# Altium footprint library ThanhNT.PcbLib: 579 footprints (part 31 of 37)
Each footprint in its own frame and in the unit in brackets; x right, y up, seen from the top. Pads: shape width x height; smd on the part's side, far side on the other; paste and mask are expansions set on the pad; w line width, h text height; cw(c..) or ccw(c..) is an arc to the next point about the centre after c.
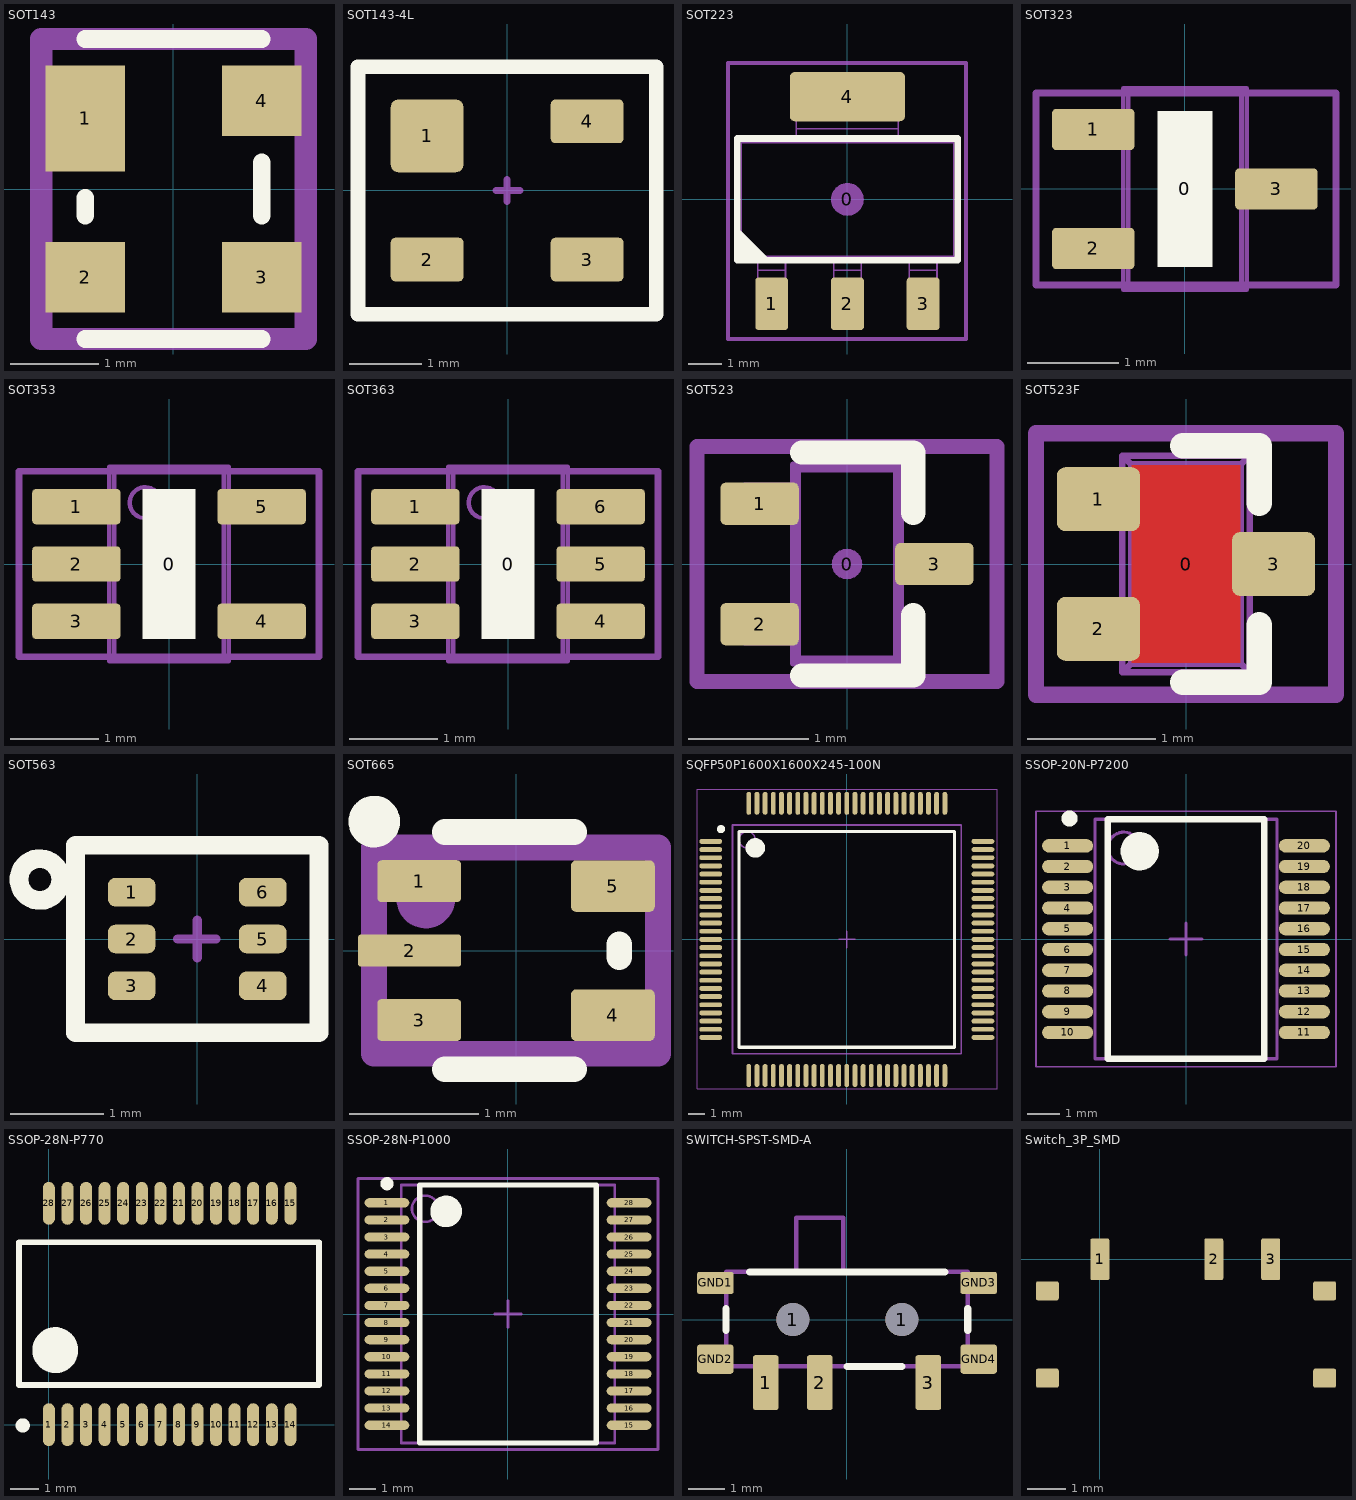
[diagram p30: the footprints below, top view; thin cyan lines are the x and y axes]

## SOT143 [mm]
pads (4):
  rect 0.9x1.2 smd: 1(-1,0.8)
  rect 0.9x0.8 smd: 2(-1,-1) 3(1,-1) 4(1,1)
Top Overlay:
  lines w0.2: -1,-1.7 1,-1.7 ; -1,-0.3 -1,-0.1 ; -1,1.7 1,1.7 ; 1,-0.3 1,0.3
Mechanical 16:
  circle w0.254: c-1,1.1 r0.1
  lines w0.254: -1.5,-1.7 -1.5,1.7 1.5,1.7 1.5,-1.7 -1.5,-1.7
3D body: height 1, standoff 0, extent -1,-1.7 1,1.7

## SOT143-4L [mm] "SOT143-4L, 4-Leads, Body 2.95x2.4mm, Pitch 1.70/1.90mm"
height 1.075
pads (4):
  rrect20% 1x1 smd: 1(-1.1,0.75)
  rrect20% 1x0.6 smd: 2(-1.1,-0.95) 3(1.1,-0.95) 4(1.1,0.95)
Top Overlay:
  lines w0.2: -2.05,-1.7 2.05,-1.7 2.05,1.7 -2.05,1.7 -2.05,-1.675
  text "." at -2.408,0.777 h0.1
Mechanical 15:
  lines w0.1: -2.05,-1.7 -2.05,1.7 ; -0.15,0 0.175,0 ; 0,-0.15 0,0.15 ; 2.075,-1.688 2.075,1.741
  lines w0.102: -2.05,-1.7 2.05,-1.7 ; -1.989,1.741 2.075,1.741
3D body "WE-TVS_High_Speed_SOT143-4L.stp": height 1.03, standoff -0.03, extent -1.2,-1.46 1.2,1.46

## SOT223 [mm] "SOT223 /SC-73"
height 1.524
pads (5):
  round 1 on Mech15: 0(0,0)
  rrect20% 1x1.6 smd: 1(-2.3,-3.173) 2(0,-3.173) 3(2.3,-3.173)
  rrect20% 3.5x1.5 smd: 4(0,3.124)
Top Overlay:
  region: -3.35,-1.85 -3.35,-0.85 -2.35,-1.85
  lines w0.2: -3.35,-1.85 -3.35,1.85 3.35,1.85 3.35,-1.85 -3.35,-1.85
Mechanical 13:
  lines w0.05: -2.72,-3.186 -1.88,-3.186 ; -2.72,-3.062 -1.88,-3.062 ; -2.72,-2.506 -1.88,-2.506 ; -2.72,-2.152 -1.88,-2.152 ; -2.72,-1.85 -3.35,-1.85 ; -1.88,-1.85 -0.42,-1.85 ; -1.55,1.85 -3.35,1.85 ; -1.55,2.152 1.55,2.152 ; -1.55,2.506 1.55,2.506 ; -1.55,3.062 1.55,3.062 ; -1.55,3.186 1.55,3.186 ; -0.42,-3.186 0.42,-3.186 ; -0.42,-3.062 0.42,-3.062 ; -0.42,-2.506 0.42,-2.506 ; -0.42,-2.152 0.42,-2.152 ; 0.42,-1.85 1.88,-1.85 ; 1.55,1.85 3.35,1.85 ; 1.88,-3.186 2.72,-3.186 ; 1.88,-3.062 2.72,-3.062 ; 1.88,-2.506 2.72,-2.506 ; 1.88,-2.152 2.72,-2.152 ; 2.72,-1.85 3.35,-1.85 ; -3.35,-1.85 -3.35,1.85 ; -3.35,-1.85 -3.231,-1.731 ; -3.35,1.85 -3.231,1.731 ; -3.231,-1.731 3.231,-1.731 ; -3.231,-1.731 -3.231,1.731 ; -3.231,1.731 3.231,1.731 ; 3.231,-1.731 3.231,1.731 ; 3.231,-1.731 3.35,-1.85 ; 3.231,1.731 3.35,1.85 ; 3.35,-1.85 3.35,1.85 ; -2.72,-3.65 -2.72,-1.829 -1.88,-1.829 -1.88,-3.65 -2.72,-3.65 ; -1.55,1.829 1.55,1.829 1.55,3.65 -1.55,3.65 -1.55,1.829 ; -0.42,-3.65 -0.42,-1.829 0.42,-1.829 0.42,-3.65 -0.42,-3.65 ; 1.88,-3.65 1.88,-1.829 2.72,-1.829 2.72,-3.65 1.88,-3.65
Mechanical 15:
  lines w0.127: -3.632,-4.242 3.607,-4.242 3.607,4.14 -3.632,4.14 -3.632,-4.242
3D body "User Library-SOT223-3.STEP": height 1.7, standoff 0, extent -3.25,-3.5 3.25,3.5

## SOT323 [mm] "Small outline 2.1mm L x 1.25mm W x 1.1mm H; 3 lead SC70, EIAJ SC-70, SOT323"
height 1.1
pads (4):
  round 0.5 on Mech15: 0(0,0)
  rrect20% 0.9x0.45 smd: 1(-1,0.65) 2(-1,-0.65) 3(1,0)
Top Overlay:
  rectangle: -0.3,-0.85 0.3,0.85
  text "." at -1.875,0.65 h0.1
Mechanical 13:
  lines w0.05: -1.028,-0.8 -1.028,-0.5 ; -1.028,0.5 -1.028,0.8 ; -0.937,-0.8 -0.937,-0.5 ; -0.937,0.5 -0.937,0.8 ; -0.925,-0.8 -0.925,-0.5 ; -0.925,0.5 -0.925,0.8 ; 0.925,-0.15 0.925,0.15 ; 0.937,-0.15 0.937,0.15 ; 1.028,-0.15 1.028,0.15 ; -0.675,-1.1 0.675,-1.1 ; -0.675,-1.1 -0.675,1.1 ; -0.675,-1.1 -0.619,-1.044 ; -0.675,1.1 0.675,1.1 ; -0.675,1.1 -0.619,1.043 ; -0.619,-1.044 0.619,-1.044 ; -0.619,-1.044 -0.619,1.043 ; -0.619,1.043 0.619,1.043 ; 0.619,-1.044 0.675,-1.1 ; 0.619,-1.044 0.619,1.043 ; 0.619,1.043 0.675,1.1 ; 0.675,-1.1 0.675,1.1 ; -1.2,-0.8 -1.2,-0.5 -0.654,-0.5 -0.654,-0.8 -1.2,-0.8 ; -1.2,0.5 -1.2,0.8 -0.654,0.8 -0.654,0.5 -1.2,0.5 ; 0.654,-0.15 1.2,-0.15 1.2,0.15 0.654,0.15 0.654,-0.15
Mechanical 15:
  lines w0.076: -1.626,-1.05 -1.626,1.05 1.651,1.05 1.651,-1.05 -1.626,-1.05
3D body "SOT323.STEP": height 1.1, standoff 0, extent -1.2,-1.1 1.2,1.1

## SOT353 [mm] "Small outline 2.1mm L x 1.25mm W x 1mm H; 5LD SC-70; SC-88A"
height 1.1
pads (6):
  round 0.5 on Mech15: 0(0,0)
  rrect20% 1x0.4 smd: 1(-1.05,0.65) 2(-1.05,0) 3(-1.05,-0.65) 4(1.05,-0.65) 5(1.05,0.65)
Top Overlay:
  rectangle: -0.3,-0.85 0.3,0.85
  text "." at -2.025,0.65 h0.1
Top Solder:
  rectangle: -1.397,-0.762 -0.635,0.762
Mechanical 13:
  circle w0.05: c-0.27,0.695 r0.175
  lines w0.05: -1.028,-0.8 -1.028,-0.5 ; -1.028,-0.15 -1.028,0.15 ; -1.028,0.5 -1.028,0.8 ; -0.937,-0.8 -0.937,-0.5 ; -0.937,-0.15 -0.937,0.15 ; -0.937,0.5 -0.937,0.8 ; -0.925,-0.8 -0.925,-0.5 ; -0.925,-0.15 -0.925,0.15 ; -0.925,0.5 -0.925,0.8 ; 0.925,-0.8 0.925,-0.5 ; 0.925,0.5 0.925,0.8 ; 0.937,-0.8 0.937,-0.5 ; 0.937,0.5 0.937,0.8 ; 1.028,-0.8 1.028,-0.5 ; 1.028,0.5 1.028,0.8 ; -0.675,-1.1 0.675,-1.1 ; -0.675,-1.1 -0.675,1.1 ; -0.675,-1.1 -0.619,-1.044 ; -0.675,1.1 0.675,1.1 ; -0.675,1.1 -0.619,1.044 ; -0.619,-1.044 0.619,-1.044 ; -0.619,-1.044 -0.619,1.044 ; -0.619,1.044 0.619,1.044 ; 0.619,-1.044 0.675,-1.1 ; 0.619,-1.044 0.619,1.044 ; 0.619,1.044 0.675,1.1 ; 0.675,-1.1 0.675,1.1 ; -1.2,-0.8 -1.2,-0.5 -0.654,-0.5 -0.654,-0.8 -1.2,-0.8 ; -1.2,-0.15 -1.2,0.15 -0.654,0.15 -0.654,-0.15 -1.2,-0.15 ; -1.2,0.5 -1.2,0.8 -0.654,0.8 -0.654,0.5 -1.2,0.5 ; 0.654,-0.8 1.2,-0.8 1.2,-0.5 0.654,-0.5 0.654,-0.8 ; 0.654,0.5 1.2,0.5 1.2,0.8 0.654,0.8 0.654,0.5
Mechanical 15:
  lines w0.076: -1.7,-1.05 1.7,-1.05 1.7,1.05 -1.7,1.05 -1.7,-1.05
3D body "SOT353.STEP": height 1.1, standoff 0, extent -1.2,-1.1 1.2,1.1

## SOT363 [mm] "Small outline 2.1mm L x 1.25mm W x 1mm H"
height 1
pads (7):
  round 0.5 on Mech15: 0(0,0)
  rrect20% 1x0.4 smd: 1(-1.05,0.65) 2(-1.05,0) 3(-1.05,-0.65) 4(1.05,-0.65) 5(1.05,0) 6(1.05,0.65)
Top Overlay:
  rectangle: -0.3,-0.85 0.3,0.85
  text "." at -2.025,0.65 h0.1
Top Solder:
  region: 1.397,0.762 0.635,0.762 0.635,-0.762 1.397,-0.762
  rectangle: -1.397,-0.762 -0.635,0.762
Mechanical 13:
  circle w0.05: c-0.27,0.695 r0.175
  lines w0.05: -1.028,-0.8 -1.028,-0.5 ; -1.028,-0.15 -1.028,0.15 ; -1.028,0.5 -1.028,0.8 ; -0.937,-0.8 -0.937,-0.5 ; -0.937,-0.15 -0.937,0.15 ; -0.937,0.5 -0.937,0.8 ; -0.925,-0.8 -0.925,-0.5 ; -0.925,-0.15 -0.925,0.15 ; -0.925,0.5 -0.925,0.8 ; 0.925,-0.8 0.925,-0.5 ; 0.925,-0.15 0.925,0.15 ; 0.925,0.5 0.925,0.8 ; 0.937,-0.8 0.937,-0.5 ; 0.937,-0.15 0.937,0.15 ; 0.937,0.5 0.937,0.8 ; 1.028,-0.8 1.028,-0.5 ; 1.028,-0.15 1.028,0.15 ; 1.028,0.5 1.028,0.8 ; -0.675,-1.1 -0.619,-1.044 ; -0.675,-1.1 -0.675,1.1 ; -0.675,-1.1 0.675,-1.1 ; -0.675,1.1 -0.619,1.044 ; -0.675,1.1 0.675,1.1 ; -0.619,-1.044 -0.619,1.044 ; -0.619,-1.044 0.619,-1.044 ; -0.619,1.044 0.619,1.044 ; 0.619,-1.044 0.619,1.044 ; 0.619,-1.044 0.675,-1.1 ; 0.619,1.044 0.675,1.1 ; 0.675,-1.1 0.675,1.1 ; -1.2,-0.8 -0.654,-0.8 -0.654,-0.5 -1.2,-0.5 -1.2,-0.8 ; -1.2,-0.15 -0.654,-0.15 -0.654,0.15 -1.2,0.15 -1.2,-0.15 ; -1.2,0.5 -0.654,0.5 -0.654,0.8 -1.2,0.8 -1.2,0.5 ; 0.654,-0.8 0.654,-0.5 1.2,-0.5 1.2,-0.8 0.654,-0.8 ; 0.654,-0.15 0.654,0.15 1.2,0.15 1.2,-0.15 0.654,-0.15 ; 0.654,0.5 0.654,0.8 1.2,0.8 1.2,0.5 0.654,0.5
Mechanical 15:
  lines w0.076: -1.7,-1.05 1.7,-1.05 1.7,1.05 -1.7,1.05 -1.7,-1.05
3D body "SOT363.STEP": height 1.1, standoff 0, extent -1.2,-1.1 1.2,1.1

## SOT523 [mm] "3 Lead SC75; EIAJ-SC75; SOT523; SOT416?"
height 0.9
pads (4):
  round 0.254 on Mech15: 0(0,0)
  rrect25% 0.65x0.35 smd: 1(-0.725,0.5) 2(-0.725,-0.5) 3(0.725,0)
Top Overlay:
  lines w0.2: -0.375,-0.925 0.55,-0.925 0.55,-0.425 ; -0.375,0.925 0.55,0.925 0.55,0.425
  text "." at -1.455,0.5 h0.05
Mechanical 13:
  lines w0.05: -0.669,-0.65 -0.669,-0.35 ; -0.669,0.35 -0.669,0.65 ; -0.623,-0.65 -0.623,-0.35 ; -0.623,0.35 -0.623,0.65 ; -0.61,-0.65 -0.61,-0.35 ; -0.61,0.35 -0.61,0.65 ; 0.61,-0.15 0.61,0.15 ; 0.623,-0.15 0.623,0.15 ; 0.669,-0.15 0.669,0.15 ; -0.45,-0.825 -0.408,-0.783 ; -0.45,-0.825 -0.45,0.825 ; -0.45,-0.825 0.45,-0.825 ; -0.45,0.825 -0.408,0.783 ; -0.45,0.825 0.45,0.825 ; -0.408,-0.783 -0.408,0.783 ; -0.408,-0.783 0.408,-0.783 ; -0.408,0.783 0.408,0.783 ; 0.408,-0.783 0.408,0.783 ; 0.408,-0.783 0.45,-0.825 ; 0.408,0.783 0.45,0.825 ; 0.45,-0.825 0.45,0.825 ; -0.85,-0.65 -0.429,-0.65 -0.429,-0.35 -0.85,-0.35 -0.85,-0.65 ; -0.85,0.35 -0.429,0.35 -0.429,0.65 -0.85,0.65 -0.85,0.35 ; 0.429,-0.15 0.429,0.15 0.85,0.15 0.85,-0.15 0.429,-0.15
Mechanical 15:
  lines w0.127: -1.245,-0.975 -1.245,0.975 1.245,0.975 1.245,-0.975 -1.245,-0.975
3D body "SOT523.STEP": height 0.9, standoff 0, extent -0.85,-0.825 0.85,0.825

## SOT523F [mil] "3 Lead SC89; EIAJ-SC89; SOT523F"
height 31.5
pads (4):
  round 10 on Mech15: 0(0,0)
  rrect25% 25.59x19.68 smd: 1(-27,20) 2(-27,-20) 3(27,0)
Top Layer:
  pour cut-out: -16.73,30.51 16.73,30.51 16.73,-30.51 -16.73,-30.51
Top Overlay:
  lines w7.87: -0.98,-36.42 22.64,-36.42 22.64,-18.7 ; -0.98,36.42 22.64,36.42 22.64,18.7
  text "." at -51.18,19.68 h1.97
Mechanical 13:
  lines w1.97: -19.65,-26.57 -19.65,-33.43 ; -19.65,-12.8 -19.65,12.8 ; -19.65,26.57 -19.65,33.43 ; 19.65,-6.89 19.65,-33.43 ; 19.65,6.89 19.65,33.43 ; -19.65,-33.43 -16.93,-30.71 ; -19.65,-33.43 19.65,-33.43 ; -19.65,33.43 -16.93,30.71 ; -19.65,33.43 19.65,33.43 ; -16.93,-30.71 -16.93,30.71 ; -16.93,-30.71 16.93,-30.71 ; -16.93,30.71 16.93,30.71 ; 16.93,-30.71 19.65,-33.43 ; 16.93,-30.71 16.93,30.71 ; 16.93,30.71 19.65,33.43 ; -33.46,-26.57 -19,-26.57 -19,-12.8 -33.46,-12.8 -33.46,-26.57 ; -33.46,12.8 -19,12.8 -19,26.57 -33.46,26.57 -33.46,12.8 ; 19,-6.89 19,6.89 33.46,6.89 33.46,-6.89 19,-6.89
Mechanical 15:
  lines w5: -46.26,-40.35 -46.26,40.35 46.26,40.35 46.26,-40.35 -46.26,-40.35
3D body "SOT523F.STEP": height 31.5, standoff 0, extent -33.46,-33.43 33.48,33.43

## SOT563 [mil] "SOT563, 6-Leads, Body 1.6x1.6mm, Pitch 0.5mm"
height 45.67
pads (6):
  rrect50% 20x12 smd: 1(-27.56,19.68) 2(-27.56,0) 3(-27.56,-19.68) 4(27.56,-19.68) 5(27.56,0) 6(27.56,19.68)
Top Overlay:
  circle w7.87: c-66.14,25 r8.77
  lines w7.87: -51.18,-39.37 51.18,-39.37 51.18,39.37 -51.18,39.37 -51.18,-39.37
Mechanical 15:
  lines w3.94: -51.18,-39.37 -51.18,39.37 ; -8.19,0 7.87,0 ; 0,-7.87 0,7.87 ; 51.18,-39.37 51.18,39.37
  lines w4: -51.18,-39.37 51.18,-39.37 ; -51.18,39.37 51.18,39.37
3D body "WE-TVS_High_Speed_SOT563.stp": height 21.65, standoff 0, extent -31.49,-31.5 31.51,31.5

## SOT665 [mm]
pads (5):
  rrect20% 0.65x0.325 smd mask+0.05: 1(-0.75,0.538) 3(-0.75,-0.538)
  rrect20% 0.8x0.25 smd mask+0.05: 2(-0.825,0)
  rrect20% 0.65x0.4 smd mask+0.05: 4(0.75,-0.5) 5(0.75,0.5)
Top Overlay:
  circle w0.2: c-1.1,1 r0.1
  lines w0.2: -0.55,-0.92 0.45,-0.92 ; -0.55,0.92 0.45,0.92 ; 0.8,-0.05 0.8,0.05
Mechanical 16:
  circle w0.254: c-0.7,0.4 r0.1
  lines w0.2: -1.1,-0.8 -1.1,0.8 1.1,0.8 1.1,-0.8 -1.1,-0.8
3D body "SOT50P160X60-5.step": height 0.6, standoff 0, extent -0.8,-0.796 0.8,0.795

## SQFP50P1600X1600X245-100N [mm] "SQFP, 100-Leads, Body 14.00x14.00mm, Pitch 0.50mm, IPC Medium Density"
height 2.45
pads (100):
  oval 1.4x0.3 smd: 1(-8.331,6) 2(-8.331,5.5) 3(-8.331,5) 4(-8.331,4.5) 5(-8.331,4) 6(-8.331,3.5) 7(-8.331,3) 8(-8.331,2.5) 9(-8.331,2) 10(-8.331,1.5) 11(-8.331,1) 12(-8.331,0.5) 13(-8.331,0) 14(-8.331,-0.5) 15(-8.331,-1) 16(-8.331,-1.5) 17(-8.331,-2) 18(-8.331,-2.5) 19(-8.331,-3) 20(-8.331,-3.5) 21(-8.331,-4) 22(-8.331,-4.5) 23(-8.331,-5) 24(-8.331,-5.5) 25(-8.331,-6) 51(8.331,-6) 52(8.331,-5.5) 53(8.331,-5) 54(8.331,-4.5) 55(8.331,-4) 56(8.331,-3.5) 57(8.331,-3) 58(8.331,-2.5) 59(8.331,-2) 60(8.331,-1.5) 61(8.331,-1) 62(8.331,-0.5) 63(8.331,0) 64(8.331,0.5) 65(8.331,1) 66(8.331,1.5) 67(8.331,2) 68(8.331,2.5) 69(8.331,3) 70(8.331,3.5) 71(8.331,4) 72(8.331,4.5) 73(8.331,5) 74(8.331,5.5) 75(8.331,6)
  oval 0.3x1.4 smd: 26(-6,-8.331) 27(-5.5,-8.331) 28(-5,-8.331) 29(-4.5,-8.331) 30(-4,-8.331) 31(-3.5,-8.331) 32(-3,-8.331) 33(-2.5,-8.331) 34(-2,-8.331) 35(-1.5,-8.331) 36(-1,-8.331) 37(-0.5,-8.331) 38(0,-8.331) 39(0.5,-8.331) 40(1,-8.331) 41(1.5,-8.331) 42(2,-8.331) 43(2.5,-8.331) 44(3,-8.331) 45(3.5,-8.331) 46(4,-8.331) 47(4.5,-8.331) 48(5,-8.331) 49(5.5,-8.331) 50(6,-8.331) 76(6,8.331) 77(5.5,8.331) 78(5,8.331) 79(4.5,8.331) 80(4,8.331) 81(3.5,8.331) 82(3,8.331) 83(2.5,8.331) 84(2,8.331) 85(1.5,8.331) 86(1,8.331) 87(0.5,8.331) 88(0,8.331) 89(-0.5,8.331) 90(-1,8.331) 91(-1.5,8.331) 92(-2,8.331) 93(-2.5,8.331) 94(-3,8.331) 95(-3.5,8.331) 96(-4,8.331) 97(-4.5,8.331) 98(-5,8.331) 99(-5.5,8.331) 100(-6,8.331)
Top Overlay:
  circle w0.25: c-7.7,6.75 r0.125
  circle w0.6: c-5.6,5.6 r0.3
  lines w0.2: -6.6,-6.6 -6.6,6.6 6.6,6.6 6.6,-6.6 -6.6,-6.6
Mechanical 13:
  circle w0.1: c-6.1,6.1 r0.5
  lines w0.1: -7,-7 -7,7 7,7 7,-7 -7,-7
Mechanical 15:
  lines w0.05: -9.169,-9.144 -9.169,9.195 9.195,9.195 9.195,-9.144 -9.169,-9.144
  lines w0.1: -0.5,0 0.5,0 ; 0,-0.5 0,0.5
3D body "User Library-IPC QFP24QFP50P1660X1660X245-100N MS-029CA S-R-PQFP.STEP": height 2.46, standoff -0.14, extent -8.328,-8.328 8.328,8.328

## SSOP-20N-P7200 [mm] "SOP, 20-Leads, Body 7.20x5.50mm, Pitch 0.65mm, IPC Medium Density"
height 2
pads (20):
  oval 1.6x0.42 smd: 1(-3.708,2.921) 2(-3.708,2.271) 3(-3.708,1.621) 4(-3.708,0.971) 5(-3.708,0.321) 6(-3.708,-0.329) 7(-3.708,-0.979) 8(-3.708,-1.629) 9(-3.708,-2.279) 10(-3.708,-2.929) 11(3.708,-2.929) 12(3.708,-2.279) 13(3.708,-1.629) 14(3.708,-0.979) 15(3.708,-0.329) 16(3.708,0.321) 17(3.708,0.971) 18(3.708,1.621) 19(3.708,2.271) 20(3.708,2.921)
Top Overlay:
  circle w0.6: c-1.45,2.75 r0.3
  circle w0.25: c-3.65,3.775 r0.125
  lines w0.2: -2.45,-3.75 2.45,-3.75 2.45,3.75 -2.45,3.75 -2.45,-3.75
Mechanical 13:
  circle w0.1: c-1.95,2.85 r0.5
  lines w0.1: -2.85,-3.75 2.85,-3.75 2.85,3.75 -2.85,3.75 -2.85,-3.75
Mechanical 15:
  lines w0.05: -4.7,-4 4.7,-4 4.7,4 -4.7,4 -4.7,-4
  lines w0.1: -0.5,0 0.5,0 ; 0,-0.5 0,0.5
3D body "User Library-SSOP 20 PIN-1.STEP": height 1.88, standoff -0.11, extent -3.924,-3.665 3.976,3.665

## SSOP-28N-P770 [mil]
pads (28):
  oval 16.53x59.03 smd mask+7.9: 1(0,0) 2(25.6,0) 3(51.18,0) 4(76.78,0) 5(102.37,0) 6(127.97,0) 7(153.57,0) 8(179.15,0) 9(204.75,0) 10(230.35,0) 11(255.93,0) 12(281.53,0) 13(307.12,0) 14(332.7,0) 15(332.7,305) 16(307.12,305) 17(281.53,305) 18(255.93,305) 19(230.35,305) 20(204.75,305) 21(179.15,305) 22(153.57,305) 23(127.97,305) 24(102.37,305) 25(76.78,305) 26(51.18,305) 27(25.6,305) 28(0,305)
Top Overlay:
  circle w9.84: c-36.1,-1.12 r4.92
  circle w39.37: c8.8,102.7 r11.88
  lines w7.87: -41.22,54.66 372.21,54.66 372.21,251.53 -41.22,251.53 -41.22,54.66
3D body "SOP65P770x200-28N.step": height 84.65, standoff 0, extent -37.01,0.01 369.69,305.35

## SSOP-28N-P1000 [mm] "SOP, 28-Leads, Body 9.7x8mm, Pitch 0.65mm, IPC Medium Density"
height 2
pads (28):
  oval 1.7x0.35 smd: 1(-4.6,4.225) 2(-4.6,3.575) 3(-4.6,2.925) 4(-4.6,2.275) 5(-4.6,1.625) 6(-4.6,0.975) 7(-4.6,0.325) 8(-4.6,-0.325) 9(-4.6,-0.975) 10(-4.6,-1.625) 11(-4.6,-2.275) 12(-4.6,-2.925) 13(-4.6,-3.575) 14(-4.6,-4.225) 15(4.6,-4.225) 16(4.6,-3.575) 17(4.6,-2.925) 18(4.6,-2.275) 19(4.6,-1.625) 20(4.6,-0.975) 21(4.6,-0.325) 22(4.6,0.325) 23(4.6,0.975) 24(4.6,1.625) 25(4.6,2.275) 26(4.6,2.925) 27(4.6,3.575) 28(4.6,4.225)
Top Overlay:
  circle w0.6: c-2.35,3.9 r0.3
  circle w0.25: c-4.6,4.95 r0.125
  lines w0.2: -3.35,-4.9 3.35,-4.9 3.35,4.9 -3.35,4.9 -3.35,-4.9
Mechanical 13:
  circle w0.1: c-3.15,4 r0.5
  lines w0.1: -4.05,-4.9 4.05,-4.9 4.05,4.9 -4.05,4.9 -4.05,-4.9
Mechanical 15:
  lines w0.1: -0.5,0 0.5,0 ; 0,-0.5 0,0.5 ; -5.7,-5.15 5.7,-5.15 5.7,5.15 -5.7,5.15 -5.7,-5.15
3D body: height 2, standoff 0, extent -4.05,-4.9 4.05,4.9

## SWITCH-SPST-SMD-A [mil]
pads (9):
  rrect20% 28x60 smd: 1(-88.58,-68.9) 2(-29.53,-68.9) 3(89,-68.9)
  round 36 hole 36: 1(-59.06,0) 1(60,0)
  rrect20% 40x24 smd: GND1(-143.7,40) GND3(144,40)
  rrect20% 40x32 smd: GND2(-143.7,-43.31) GND4(144,-43.31)
Top Overlay:
  lines w7.87: -131.89,-11.81 -131.89,12 ; -106.3,52 107,52 ; 0,-51.18 60,-51.18 ; 132,-11.81 132,12
Mechanical 16:
  lines w5: -55.12,52 -3.94,52 ; -55.12,52 -131.89,52 -131.89,-51.18 132,-51.18 132,52 -3.94,52 ; -55.12,52 -55.12,111 -3.94,111 -3.94,52
3D body "User Library-MiniSwitch.STEP": height 55.62, standoff -19.18, extent -150.57,-87 152.57,101.98

## Switch_3P_SMD [mm]
pads (7):
  rrect20% 0.5x1.1 smd: 1(0,0) 2(3,0) 3(4.5,0)
  rrect20% 0.6x0.5 smd: ""(-1.381,-3.13) ""(-1.381,-0.83) ""(5.919,-3.13) ""(5.919,-0.83)
3D body "User Library-pcm12smtr.STEP": height 1.4, standoff -0.5, extent -1.421,-4.194 5.933,0.38